# Altium footprint library PCB_GENERAL.PcbLib: 226 footprints (part 3 of 15)
Each footprint in its own frame and in the unit in brackets; x right, y up, seen from the top. Pads: shape width x height; smd on the part's side, far side on the other; paste and mask are expansions set on the pad; w line width, h text height; cw(c..) or ccw(c..) is an arc to the next point about the centre after c.
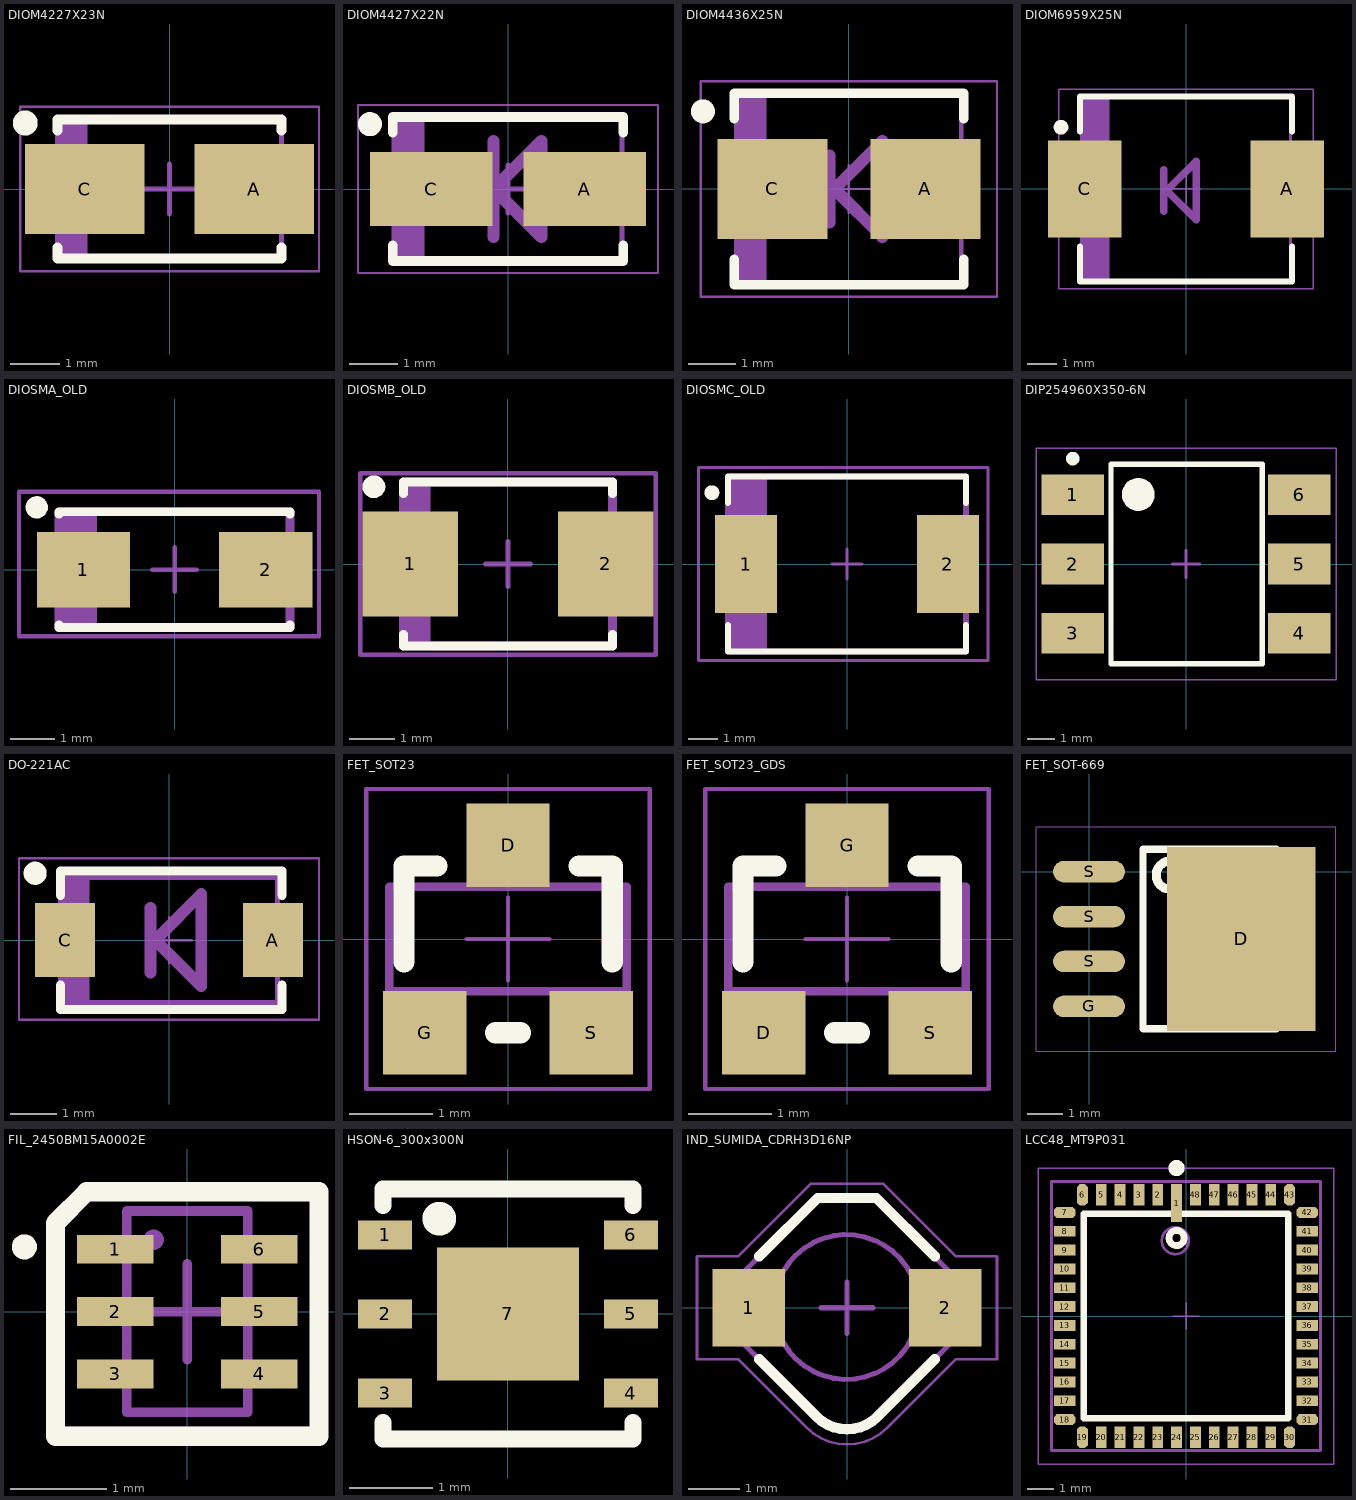
[diagram p2: the footprints below, top view; thin cyan lines are the x and y axes]

## DIOM4227X23N [mm] "Molded Diode, 2-Leads, Body 4,25x2,67mm, IPC Medium Density"
height 2.29
pads (2):
  rect 2.4x1.8 smd: A(1.7,0) C(-1.7,0)
Top Overlay:
  circle w0.25: c-2.9,1.325 r0.125
  lines w0.2: -2.25,-1.175 -2.25,-1.4 2.25,-1.4 2.25,-1.175 ; -2.25,1.175 -2.25,1.4 2.25,1.4 2.25,1.175
Mechanical 11:
  text ".Designator" at -1.675,1.925 h0.3
Mechanical 14:
  rectangle: -2.25,-1.395 -1.645,1.395
  lines w0.1: -2.25,-1.395 -2.25,1.395 2.25,1.395 2.25,-1.395 -2.25,-1.395
Mechanical 15:
  lines w0.05: -3,-1.65 -3,1.65 3,1.65 3,-1.65 -3,-1.65
  lines w0.1: -0.5,0 0.5,0 ; 0,-0.5 0,0.5
3D body "DIO_SMA_DO-214AC.step": height 2.46, standoff 0.02, extent -2.5,-1.35 2.5,1.35

## DIOM4427X22N [mm] "Molded Diode, 2-Leads, Body 4,38x2,73mm, IPC Medium Density"
height 2.2
pads (2):
  rect 2.55x1.55 smd: A(1.6,0) C(-1.6,0)
Top Overlay:
  circle w0.25: c-2.875,1.35 r0.125
  lines w0.2: -2.4,-1.175 -2.4,-1.5 2.4,-1.5 2.4,-1.175 ; -2.4,1.175 -2.4,1.5 2.4,1.5 2.4,1.175
Mechanical 11:
  text ".Designator" at -1.2,1.125 h0.3
Mechanical 14:
  rectangle: -2.375,-1.475 -1.736,1.475
  lines w0.1: -2.375,-1.475 2.375,-1.475 2.375,1.475 -2.375,1.475 -2.375,-1.475
  lines w0.254: -0.3,-1 -0.3,1 ; -0.3,0 0.7,-1 0.7,1 -0.3,0
Mechanical 15:
  lines w0.05: -3.125,-1.75 3.125,-1.75 3.125,1.75 -3.125,1.75 -3.125,-1.75
  lines w0.1: -0.5,0 0.5,0 ; 0,-0.5 0,0.5
3D body "DIOM4427X22N.step": height 2.2, standoff 0, extent -2.595,-1.475 2.595,1.475

## DIOM4436X25N [mm] "Molded Diode, 2-Leads, Body 4,38x3,62mm, IPC Medium Density"
height 2.5
pads (2):
  rect 2.3x2.1 smd: A(1.6,0) C(-1.6,0)
Top Overlay:
  circle w0.25: c-3.05,1.625 r0.125
  lines w0.2: -2.4,-1.475 -2.4,-2 2.4,-2 2.4,-1.475 ; -2.4,1.475 -2.4,2 2.4,2 2.4,1.475
Mechanical 11:
  text ".Designator" at -1.25,-0.1 h0.3
Mechanical 14:
  rectangle: -2.35,-1.97 -1.718,1.97
  lines w0.1: -2.35,-1.97 2.35,-1.97 2.35,1.97 -2.35,1.97 -2.35,-1.97
  lines w0.254: -0.4,-0.7 -0.4,0.7 ; -0.3,0 -0.2,0.1 0.7,1 0.7,-1 -0.3,0
Mechanical 15:
  lines w0.05: -0.5,0 0.5,0 ; 0,-0.5 0,0.5 ; -3.1,-2.25 3.1,-2.25 3.1,2.25 -3.1,2.25 -3.1,-2.25
3D body "DO-214AA_SMB.step": height 2.24, standoff -0.01, extent -2.65,-1.85 2.65,1.85

## DIOM6959X25N [mm] "Molded Diode, 2-Leads, Body 6,85x5,90mm, IPC Medium Density"
height 2.5
pads (2):
  rect 2.5x3.3 smd: A(3.45,0) C(-3.45,0)
Top Overlay:
  circle w0.25: c-4.25,2.1 r0.125
  lines w0.2: -3.6,-1.95 -3.6,-3.15 3.6,-3.15 3.6,-1.95 ; -3.6,1.95 -3.6,3.15 3.6,3.15 3.6,1.95
Mechanical 11:
  text ".Designator" at -1.5,-0.15 h0.3
Mechanical 14:
  rectangle: -3.555,-3.11 -2.599,3.11
  lines w0.1: -3.555,-3.11 3.555,-3.11 3.555,3.11 -3.555,3.11 -3.555,-3.11
  lines w0.254: -0.75,-0.75 -0.75,0.65 ; -0.65,-0.05 -0.55,0.05 0.35,0.95 0.35,-1.05 -0.65,-0.05
Mechanical 15:
  lines w0.05: -0.5,0 0.5,0 ; 0,-0.5 0,0.5 ; -4.325,-3.4 4.325,-3.4 4.325,3.4 -4.325,3.4 -4.325,-3.4
3D body "DIO_SMC_DO-214AB.step": height 2.64, standoff 0.02, extent -3.95,-2.95 3.95,2.95

## DIOSMA_OLD [mm] "DIODE SMA"
height 2.9
pads (2):
  rect 2.1x1.7 smd paste-100 mask+0.05: 1(-2.05,0) 2(2.05,0)
Top Overlay:
  circle w0.25: c-3.1,1.4 r0.125
  lines w0.2: -2.6,-1.25 -2.6,-1.3 2.6,-1.3 2.6,-1.25 ; -2.6,1.25 -2.6,1.3 2.6,1.3 2.6,1.25
Top Paste:
  region: -1.05,-0.8 -1.05,0.8 -3.05,0.8 -3.05,-0.8
  region: 3.05,-0.8 3.05,0.8 1.05,0.8 1.05,-0.8
Mechanical 11:
  text ".Designator" at -1.6,-0.5 h1.5
Mechanical 14:
  lines w0.2: -2.5,-1.3 -2.5,1.3 ; -2.3,-1.3 -2.3,1.3 ; -2.15,-1.3 -2.15,1.3 ; -2,-1.3 -2,1.3 ; -1.85,-1.3 -1.85,1.3 ; -2.6,-1.3 2.6,-1.3 2.6,1.3 -2.6,1.3 -2.6,-1.3
Mechanical 15:
  lines w0.2: -2.5,-1.3 -2.5,1.3 ; -2.3,-1.3 -2.3,1.3 ; -2.15,-1.3 -2.15,1.3 ; -2,-1.3 -2,1.3 ; -1.85,-1.3 -1.85,1.3 ; -2.6,-1.3 -2.6,1.3 2.6,1.3 2.6,-1.3 -2.6,-1.3
Mechanical 20:
  lines w0.1: -0.5,0 0.5,0 ; 0,-0.5 0,0.5 ; -3.5,-1.5 3.25,-1.5 3.25,1.75 -3.5,1.75 -3.5,-1.5
3D body "DIO_SMA_DO-214AC.step": height 2.46, standoff 0.02, extent -2.5,-1.35 2.5,1.35

## DIOSMB_OLD [mm] "DO-214AA/SMB DIODE"
height 2.65
pads (2):
  rect 2.1x2.3 smd paste-100 mask+0.05: 1(-2.15,0) 2(2.15,0)
Top Overlay:
  circle w0.25: c-2.95,1.7 r0.125
  lines w0.2: -2.3,-1.55 -2.3,-1.8 2.3,-1.8 2.3,-1.55 ; -2.3,1.55 -2.3,1.8 2.3,1.8 2.3,1.55
Top Paste:
  rectangle: -3.147,-1.092 -1.152,1.093
  region: 3.147,1.093 1.152,1.093 1.152,-1.092 3.147,-1.092
Mechanical 11:
  text ".Designator" at -2.45,2.35 h1.5
Mechanical 14:
  rectangle: -2.3,-1.7 -1.7,1.7
  lines w0.2: -2.3,-1.8 -2.3,1.8 2.3,1.8 2.3,-1.8 -2.3,-1.8
Mechanical 15:
  rectangle: -2.3,-1.7 -1.7,1.7
  lines w0.2: -2.3,-1.8 2.3,-1.8 2.3,1.8 -2.3,1.8 -2.3,-1.8
Mechanical 20:
  lines w0.1: -0.5,0 0.5,0 ; 0,-0.5 0,0.5 ; -3.25,-2 3.25,-2 3.25,2 -3.25,2 -3.25,-2
3D body "DO-214AA_SMB.step": height 2.24, standoff -0.01, extent -2.65,-1.85 2.65,1.85

## DIOSMC_OLD [mm] "Diode SMC"
height 2.65
pads (2):
  rect 2.1x3.3 smd paste-100 mask+0.05: 1(-3.4,0) 2(3.4,0)
Top Overlay:
  circle w0.25: c-4.55,2.4 r0.125
  lines w0.2: -4,-2.05 -4,-2.95 4,-2.95 4,-2.05 ; -4,2.05 -4,2.95 4,2.95 4,2.05
Top Paste:
  region: 2.4,-1.575 4.4,-1.575 4.4,1.575 2.4,1.575
  region: -4.4,-1.575 -2.4,-1.575 -2.4,1.575 -4.4,1.575
Mechanical 11:
  text ".Designator" at -2.2,-0.4 h1.5
Mechanical 14:
  lines w0.2: -3.85,-2.95 -3.85,2.95 ; -3.7,-2.95 -3.7,2.95 ; -3.55,-2.95 -3.55,2.95 ; -3.4,-2.95 -3.4,2.95 ; -3.25,-2.95 -3.25,2.95 ; -3.1,-2.95 -3.1,2.95 ; -2.95,-2.95 -2.95,2.95 ; -2.8,-2.95 -2.8,2.95 ; -4,-2.95 4,-2.95 4,2.95 -4,2.95 -4,-2.95
Mechanical 15:
  lines w0.2: -3.85,-2.95 -3.85,2.95 ; -3.7,-2.95 -3.7,2.95 ; -3.55,-2.95 -3.55,2.95 ; -3.4,-2.95 -3.4,2.95 ; -3.25,-2.95 -3.25,2.95 ; -3.1,-2.95 -3.1,2.95 ; -2.95,-2.95 -2.95,2.95 ; -2.8,-2.95 -2.8,2.95 ; -4,-2.95 -4,2.95 4,2.95 4,-2.95 -4,-2.95
Mechanical 20:
  lines w0.1: -0.5,0 0.5,0 ; 0,-0.5 0,0.5 ; -5,-3.25 4.75,-3.25 4.75,3.25 -5,3.25 -5,-3.25
3D body "DIO_SMC_DO-214AB.step": height 2.64, standoff 0.02, extent -3.95,-2.95 3.95,2.95

## DIP254960X350-6N [mm] "Surface mount DIP6"
height 3.5
pads (6):
  rect 2.3x1.5 smd: 1(-4.15,2.54) 2(-4.15,0) 3(-4.15,-2.54) 4(4.15,-2.54) 5(4.15,0) 6(4.15,2.54)
Top Overlay:
  circle w0.25: c-4.15,3.865 r0.125
  circle w0.6: c-1.75,2.55 r0.3
  lines w0.2: -2.75,-3.65 -2.75,3.65 2.8,3.65 2.8,-3.65 -2.75,-3.65
Mechanical 11:
  text ".Designator" at -1.975,-0.25 h0.76
Mechanical 14:
  circle w0.1: c-1.75,2.55 r0.5
  lines w0.1: -2.75,-3.65 -2.75,3.65 2.8,3.65 2.8,-3.65 -2.75,-3.65
Mechanical 15:
  lines w0.05: -5.5,-4.25 -5.5,4.25 5.5,4.25 5.5,-4.25 -5.5,-4.25
  lines w0.1: -0.5,0 0.5,0 ; 0,-0.5 0,0.5
3D body "SW3dPS-6-SMD.STEP": height 3.62, standoff 0.01, extent -5.08,-3.65 5.08,3.64

## DO-221AC [mm] "Molded Diode, 2-Leads, Body 4,38x3,62mm, IPC Medium Density"
height 2.5
pads (2):
  rect 1.3x1.6 smd: A(2.25,0) C(-2.25,0)
Top Overlay:
  circle w0.25: c-2.9,1.45 r0.125
  lines w0.2: -2.35,-0.975 -2.35,-1.5 2.45,-1.5 2.45,-0.975 ; -2.35,0.975 -2.35,1.5 2.45,1.5 2.45,0.975
Mechanical 11:
  text ".Designator" at -1.25,-0.1 h0.3
Mechanical 14:
  rectangle: -2.35,-1.35 -1.718,1.325
  lines w0.1: 1.041,-1.35 -0.446,-1.35 -2.35,-1.35 ; 1.066,-1.35 2.35,-1.35 2.35,1.35 -2.35,1.35 -2.35,-1.35 ; -2.35,-1.35 -2.35,-1.35
  lines w0.254: -0.4,-0.7 -0.4,0.7 ; -0.3,0 -0.2,0.1 0.7,1 0.7,-1 -0.3,0
Mechanical 15:
  lines w0.05: -0.5,0 0.5,0 ; 0,-0.5 0,0.5 ; -3.25,-1.725 3.25,-1.725 3.25,1.775 -3.25,1.775 -3.25,-1.725
3D body: height 1, standoff -0.1, extent -2.144,-1.375 2.344,1.375

## FET_SOT23 [mm]
pads (3):
  rect 1x1 smd: D(0,1.125) G(-1,-1.125) S(1,-1.125)
Top Overlay:
  lines w0.254: -1.25,-0.275 -1.25,0.875 -0.85,0.875 ; -0.15,-1.125 0.15,-1.125 ; 0.85,0.875 1.25,0.875 1.25,-0.275
Mechanical 11:
  text ".Designator" at -2.06,2.14 h0.76
Mechanical 14:
  lines w0.1: -1.2,-0.625 -1.2,-1.2 -0.7,-1.2 -0.7,-0.625 ; -0.25,0.625 -0.25,1.2 0.25,1.2 0.25,0.625 ; 0.7,-0.625 0.7,-1.2 1.2,-1.2 1.2,-0.625 ; -1.425,-0.625 1.425,-0.625 1.425,0.625 -1.425,0.625 -1.425,-0.625
Mechanical 15:
  lines w0.05: -0.5,0 0.5,0 ; 0,-0.5 0,0.5 ; -1.7,-1.8 1.7,-1.8 1.7,1.8 -1.7,1.8 -1.7,-1.8
3D body "SW3dPS-SOT-23.step": height 0.98, standoff -0.01, extent -1.448,-1.21 1.448,1.21

## FET_SOT23_GDS [mm]
pads (3):
  rect 1x1 smd: D(-1,-1.125) G(0,1.125) S(1,-1.125)
Top Overlay:
  lines w0.254: -1.25,-0.275 -1.25,0.875 -0.85,0.875 ; -0.15,-1.125 0.15,-1.125 ; 0.85,0.875 1.25,0.875 1.25,-0.275
Mechanical 11:
  text ".Designator" at -2.06,2.14 h0.76
Mechanical 14:
  lines w0.1: -1.2,-0.625 -1.2,-1.2 -0.7,-1.2 -0.7,-0.625 ; -0.25,0.625 -0.25,1.2 0.25,1.2 0.25,0.625 ; 0.7,-0.625 0.7,-1.2 1.2,-1.2 1.2,-0.625 ; -1.425,-0.625 -1.425,0.625 1.425,0.625 1.425,-0.625 -1.425,-0.625
Mechanical 15:
  lines w0.05: -0.5,0 0.5,0 ; 0,-0.5 0,0.5 ; -1.7,-1.8 -1.7,1.8 1.7,1.8 1.7,-1.8 -1.7,-1.8
3D body "SW3dPS-SOT-23.step": height 0.98, standoff -0.01, extent -1.448,-1.21 1.448,1.21

## FET_SOT-669 [mil]
pads (5):
  rect 165.35x204.72 smd: D(169.29,-74.8)
  oval 80x24 smd: G(0,-150) S(0,-100) S(0,-50) S(0,0)
Top Overlay:
  circle w10: c90.55,-3.94 r15.75
  lines w8: 60,-175 60,25 208.66,25 208.66,-175 60,-175
Mechanical 15:
  lines w0.39: -59.06,-200 275,-200 275,50 -59.06,50 -59.06,-200

## FIL_2450BM15A0002E [mm] "Chip Array, Concave, 6-Leads, Pitch 0,65mm,  Body 2,00x1,25mm,  IPC Medium Density"
height 0.8
pads (6):
  rect 0.8x0.3 smd: 1(-0.75,0.65) 2(-0.75,0) 3(-0.75,-0.65) 4(0.75,-0.65) 5(0.75,0) 6(0.75,0.65)
Top Overlay:
  circle w0.15: c-1.7,0.675 r0.056
  lines w0.2: -1.375,-1.3 1.375,-1.3 1.375,1.25 -1.05,1.25 -1.375,0.925 -1.375,-1.3
Mechanical 11:
  text ".Designator" at -1.525,1.575 h1
Mechanical 14:
  circle w0.1: c-0.35,0.75 r0.056
  lines w0.1: -0.63,-1.05 0.63,-1.05 0.63,1.05 -0.63,1.05 -0.63,-1.05
Mechanical 15:
  lines w0.05: -1.3,-1.225 -1.3,0.9 -1,1.2 1.325,1.2 1.325,-1.225 -1.3,-1.225
  lines w0.1: -0.5,0 0.5,0 ; 0,-0.5 0,0.5
3D body "User Library-Balun2450FB15L0001.STEP": height 0.8, standoff 0, extent -0.625,-1 0.625,1

## HSON-6_300x300N [mm]
pads (7):
  rect 0.65x0.35 smd: 1(-1.475,0.95) 2(-1.475,0) 3(-1.475,-0.95) 4(1.475,-0.95) 5(1.475,0) 6(1.475,0.95)
  rect 1.7x1.6 smd: 7(0,0)
Top Overlay:
  lines w0.203: -1.5,-1.3 -1.5,-1.5 1.5,-1.5 1.5,-1.3 ; -1.5,1.3 -1.5,1.5 1.5,1.5 1.5,1.3
  lines w0.254: -0.75,1.135 cw(c-0.825,1.144) -0.75,1.15

## IND_SUMIDA_CDRH3D16NP [mm] "Inductor, 4X4 mm"
height 1.8
pads (2):
  rect 1.4x1.5 smd: 1(-1.9,0) 2(1.9,0)
Top Overlay:
  lines w0.2: -1.694,-0.994 -0.597,-2.101 ; -1.693,0.994 -0.566,2.121 0.566,2.121 1.693,0.994 ; -0.594,-2.104 ccw(c0,-1.51) 0.594,-2.104 ; 0.597,-2.101 1.694,-0.994
Mechanical 11:
  text ".Designator" at -1.95,-0.3 h1
Mechanical 14:
  circle w0.1: c-0.011,0.014 r1.4
  lines w0.1: -2.15,-0.547 -2.15,0.537 -0.573,2.114 0.563,2.114 2.15,0.527 2.15,-0.537 0.573,-2.114 cw(c-0.005,-1.541) -0.578,-2.119 -2.15,-0.547
Mechanical 15:
  lines w0.05: -2.9,0.987 -2.9,-0.994 -2.106,-0.994 -0.781,-2.319 ccw(c0,-1.539) 0.781,-2.319 2.106,-0.994 2.894,-0.994 2.9,-0.994 2.9,0.987 2.893,0.994 2.106,0.994 0.7,2.4 -0.7,2.4 -2.106,0.994 -2.893,0.994
  lines w0.1: -0.5,0 0.5,0 ; 0,-0.5 0,0.5
3D body "User Library-cdrh3d18.STEP": height 2.01, standoff 0.01, extent -2.856,-2.856 2.857,2.856

## LCC48_MT9P031 [mm]
pads (48):
  rect 0.4x1.4 smd: 1(-0.35,4.2)
  rect 0.4x0.8 smd: 2(-1.05,4.5) 3(-1.75,4.5) 4(-2.45,4.5) 5(-3.15,4.5) 20(-3.15,-4.5) 21(-2.45,-4.5) 22(-1.75,-4.5) 23(-1.05,-4.5) 24(-0.35,-4.5) 25(0.35,-4.5) 26(1.05,-4.5) 27(1.75,-4.5) 28(2.45,-4.5) 29(3.15,-4.5) 44(3.15,4.5) 45(2.45,4.5) 46(1.75,4.5) 47(1.05,4.5) 48(0.35,4.5)
  oct 0.4x0.8 smd: 6(-3.85,4.5) 19(-3.85,-4.5) 30(3.85,-4.5) 43(3.85,4.5)
  oct 0.8x0.4 smd: 7(-4.5,3.85) 18(-4.5,-3.85) 31(4.5,-3.85) 42(4.5,3.85)
  rect 0.8x0.4 smd: 8(-4.5,3.15) 9(-4.5,2.45) 10(-4.5,1.75) 11(-4.5,1.05) 12(-4.5,0.35) 13(-4.5,-0.35) 14(-4.5,-1.05) 15(-4.5,-1.75) 16(-4.5,-2.45) 17(-4.5,-3.15) 32(4.5,-3.15) 33(4.5,-2.45) 34(4.5,-1.75) 35(4.5,-1.05) 36(4.5,-0.35) 37(4.5,0.35) 38(4.5,1.05) 39(4.5,1.75) 40(4.5,2.45) 41(4.5,3.15)
Top Overlay:
  circle w0.3: c-0.35,5.5 r0.15
  circle w0.254: c-0.35,2.9 r0.283
  lines w0.254: -3.8,-3.8 3.8,-3.8 3.8,3.8 -3.8,3.8 -3.8,-3.8
  text ".Designator" at -5.2,7.4 h1
Mechanical 11:
  text ".Designator" at -3.35,6.1 h1
Mechanical 14:
  circle w0.1: c-0.4,2.8 r0.5
  lines w0.1: -5,-5 -5,5 5,5 5,-5 -5,-5
Mechanical 15:
  lines w0.05: -0.5,0 0.5,0 ; 0,-0.5 0,0.5 ; -5.5,-5.5 -5.5,5.5 5.5,5.5 5.5,-5.5 -5.5,-5.5
3D body "User Library-iLCC48.STEP": height 1.25, standoff -0.01, extent -5,-5 5,5